# Altium footprint library LUMI_Handy_Soldering_LIB.PcbLib: 562 footprints (part 20 of 36)
Each footprint in its own frame and in the unit in brackets; x right, y up, seen from the top. Pads: shape width x height; smd on the part's side, far side on the other; paste and mask are expansions set on the pad; w line width, h text height; cw(c..) or ccw(c..) is an arc to the next point about the centre after c.
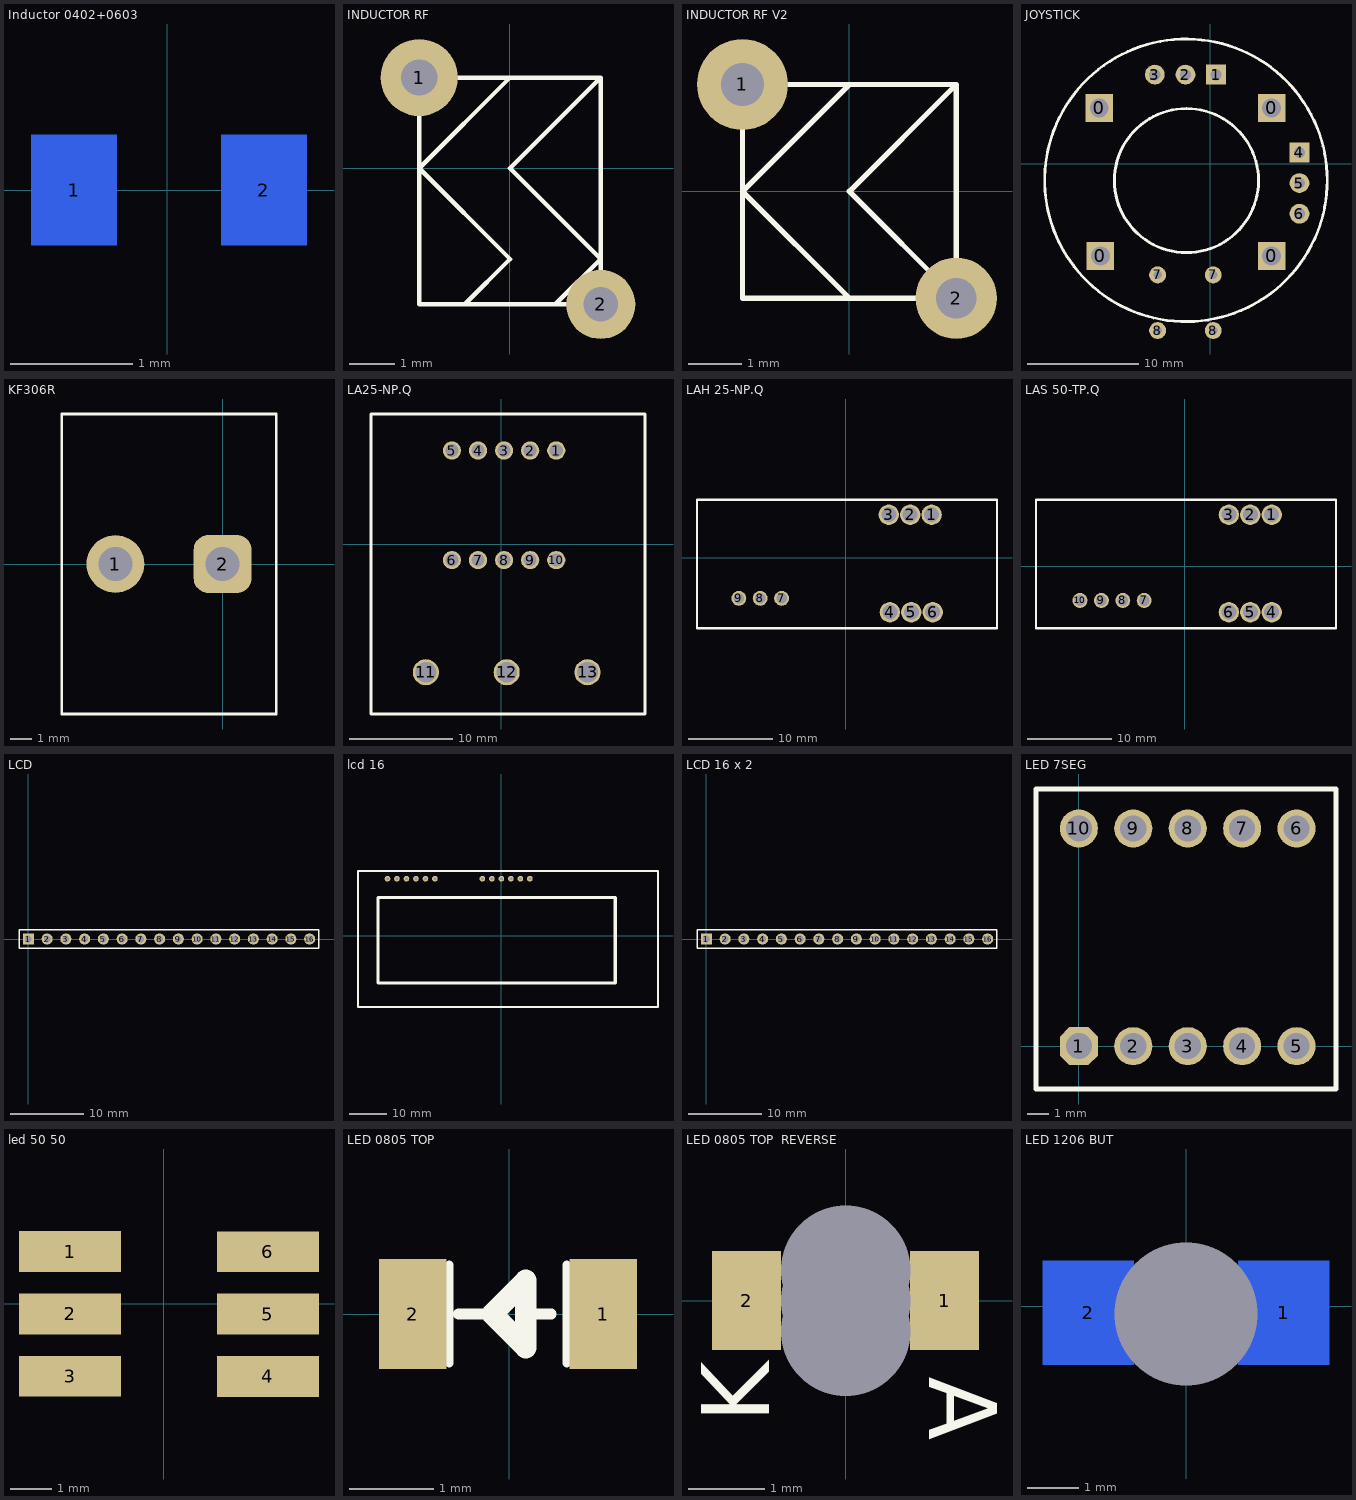
[diagram p19: the footprints below, top view; thin cyan lines are the x and y axes]

## Inductor 0402+0603 [mm]
pads (2):
  rect 0.7x0.9 smd far side: 1(-0.762,0) 2(0.787,0)
Bottom Overlay:
  rectangle: -0.356,-0.5 0,0.55
  lines w0.127: 0.321,-0.508 0.321,0.483 ; -1.143,-0.533 1.168,-0.533 1.168,0.533 -1.143,0.533 -1.143,-0.533
3D body: height 0.8, standoff 0, extent -0.8,-0.467 0.8,0.483

## INDUCTOR RF [mm]
pads (2):
  round 1.7 hole 0.8: 1(-2,2)
  round 1.524 hole 0.762: 2(2,-3)
Top Overlay:
  lines w0.1: -1,-3 0,-2 ; 1,-3 2,-2 ; 0,-2 0,-2 ; 0,-2 -2,0 0,2 2,2 ; 2,-2 2,-2 ; 2,-2 0,0 2,2 ; 2,2 2,-3 -2,-3 -2,2 2,2

## INDUCTOR RF V2 [mm]
pads (2):
  round 1.7 hole 0.8: 1(-2,2)
  round 1.524 hole 0.762: 2(2,-2)
Top Overlay:
  lines w0.1: 0,-2 -2,0 0,2 2,2 ; 0,-2 0,-2 ; 2,-2 -2,-2 -2,2 2,2 ; 2,-2 2,2 ; 2,-2 0,0 2,2 ; 2,-2 2,-2

## JOYSTICK [mm]
pads (14):
  rect 2.5x2.5 hole 1.7: 0(-10,5) 0(-9.9,-8.3) 0(5.5,-8.3) 0(5.5,5)
  rect 1.778x1.778 hole 1.016: 1(0.5,8) 4(8,1)
  round 1.778 hole 1.016: 2(-2.25,8) 3(-5,8) 5(8,-1.75) 6(8,-4.5)
  round 1.524 hole 0.762: 7(-4.75,-10) 7(0.25,-10) 8(-4.75,-15) 8(0.25,-15)
Top Overlay:
  circle w0.254: c-2.2,-1.5 r12.7
  circle w0.254: c-2.158,-1.524 r6.476
3D body: height 1.98, standoff -29.62, extent -15.108,-16.566 11.191,11.645

## KF306R [mm]
pads (2):
  round 2.7 hole 1.6: 1(-5,0)
  rrect50% 2.7x2.7 hole 1.6: 2(0,0)
Top Overlay:
  lines w0.127: -7.5,-7 -7.5,7 2.5,7 2.5,-7 -7.5,-7

## LA25-NP.Q [mil]
pads (13):
  round 70 hole 50: 1(210,360) 2(110,360) 3(10,360) 4(-90,360) 5(-190,360) 6(-190,-60) 7(-90,-60) 8(10,-60) 9(110,-60) 10(210,-60)
  round 100 hole 80: 11(-290,-490) 12(20,-490) 13(330,-490)
Top Overlay:
  lines w10: -500,-650 -500,-500 -500,500 -237.5,500 287.5,500 550,500 550,-650 -500,-650

## LAH 25-NP.Q [mil]
pads (9):
  round 95 hole 70: 1(400,200) 2(300,200) 3(200,200) 4(205,-255) 5(305,-255) 6(405,-255)
  round 70 hole 50: 7(-300,-190) 8(-400,-190) 9(-500,-190)
Top Overlay:
  lines w10: -695,-330 -195,-330 705,-330 705,270 -195,270 -695,270 -695,-330

## LAS 50-TP.Q [mil]
pads (10):
  round 95 hole 70: 1(405,240) 2(305,240) 3(205,240) 4(405,-215) 5(305,-215) 6(205,-215)
  round 70 hole 50: 7(-190,-160) 8(-290,-160) 9(-390,-160) 10(-490,-160)
Top Overlay:
  lines w10: -695,-290 -195,-290 705,-290 705,310 -195,310 -695,310 -695,-290

## LCD [mm] "Connector; Header; 16 Position"
pads (16):
  rect 1.5x1.5 hole 0.9: 1(0,0)
  round 1.5 hole 0.9: 2(2.54,0) 3(5.08,0) 4(7.62,0) 5(10.16,0) 6(12.7,0) 7(15.24,0) 8(17.78,0) 9(20.32,0) 10(22.86,0) 11(25.4,0) 12(27.94,0) 13(30.48,0) 14(33.02,0) 15(35.56,0) 16(38.1,0)
Top Overlay:
  lines w0.2: -1.27,-1.27 -1.27,1.27 0.635,1.27 39.37,1.27 39.37,-1.27 -1.27,-1.27
3D body: height 6.02, standoff -3.1, extent -1.219,-1.27 8.941,1.27
3D body: height 6.02, standoff -3.1, extent 8.89,-1.27 19.05,1.27
3D body: height 6.02, standoff -3.1, extent 19.05,-1.27 29.21,1.27
3D body: height 6.02, standoff -3.1, extent 29.185,-1.27 39.345,1.27
3D body: height 12.65, standoff 3.05, extent -15.672,-35.153 100.406,2.184

## lcd 16 [mil]
pads (12):
  round 60 hole 30: 1(-1200,600) 2(-1100,600) 3(-1000,600) 4(-900,600) 5(-800,600) 6(-700,600) 11(-200,600) 12(-100,600) 13(0,600) 14(100,600) 15(200,600) 16(300,600)
Top Overlay:
  lines w21.26: -1510,-750 -1510,680 1650,680 1650,-750 -1510,-750
  lines w31.5: -1300,400 1200,400
  lines w33.62: -1300,400 -1300,-500 1200,-500 1200,400
3D body: height 754, standoff 234, extent -1511.64,-758.5 1657.65,678.51
3D body: height 435.49, standoff 3.21, extent -1250,550 -1050,650
3D body: height 435.49, standoff 3.21, extent -1050,550 -850,650
3D body: height 435.49, standoff 3.21, extent -850,550 -650,650
3D body: height 435.49, standoff 3.21, extent -650,550 -450,650
3D body: height 435.49, standoff 3.21, extent -450,550 -250,650
3D body: height 435.49, standoff 3.21, extent -250,550 -50,650
3D body: height 435.49, standoff 3.21, extent -50,550 150,650
3D body: height 435.49, standoff 3.21, extent 150,550 350,650
3D body: height 237.01, standoff -122.05, extent -1250,550 -850,650
3D body: height 237.01, standoff -122.05, extent -850,550 -450,650
3D body: height 237.01, standoff -122.05, extent -450,550 -50,650
3D body: height 237.01, standoff -122.05, extent -49.99,550.01 350.01,650.01

## LCD 16 x 2 [mm] "Connector; Header; 16 Position"
pads (16):
  rect 1.5x1.5 hole 0.9: 1(0,0)
  round 1.5 hole 0.9: 2(2.54,0) 3(5.08,0) 4(7.62,0) 5(10.16,0) 6(12.7,0) 7(15.24,0) 8(17.78,0) 9(20.32,0) 10(22.86,0) 11(25.4,0) 12(27.94,0) 13(30.48,0) 14(33.02,0) 15(35.56,0) 16(38.1,0)
Top Overlay:
  lines w0.2: -1.27,-1.27 -1.27,1.27 0.635,1.27 39.37,1.27 39.37,-1.27 -1.27,-1.27
3D body: height 10.52, standoff -2.69, extent -8.093,-34.506 72.407,1.994

## LED 7SEG [mil]
pads (10):
  oct 70x70 hole 48: 1(0,0)
  round 70 hole 48: 2(100,0) 3(200,0) 4(300,0) 5(400,0) 6(400,400) 7(300,400) 8(200,400) 9(100,400) 10(0,400)
Top Overlay:
  lines w10: -78.74,-78.74 -78.74,472.44 472.44,472.44 472.44,-78.74 -78.74,-78.74

## led 50 50 [mm]
pads (6):
  rect 2.5x1 smd: 1(-2.286,1.27) 2(-2.286,-0.254) 3(-2.286,-1.778) 4(2.55,-1.782) 5(2.55,-0.258) 6(2.55,1.266)
3D body: height 1.6, standoff 0, extent -2.55,-2.75 2.75,2.25

## LED 0805 TOP [mm]
pads (2):
  rect 0.8x1.3 smd: 1(1.118,0) 2(-1.143,0)
Top Overlay:
  lines w0.1: -0.711,-0.584 -0.711,0.584 ; 0.686,-0.584 0.686,0.584
  lines w0.127: -0.6,0 -0.2,0 ; 0.2,0 0.5,0
  lines w0.254: -0.2,0 0.2,-0.4 0.2,0.4 -0.2,0
3D body: height 1.1, standoff 0, extent -1.01,-0.625 1.01,0.625

## LED 0805 TOP  REVERSE [mm]
pads (5):
  rect 0x0 hole 1.7: 0(0,-0.4) 0(0,0) 0(0,0.4)
  rect 0.902x1.3 smd: 1(1.3,0) 2(-1.3,0)
Top Overlay:
  lines w0.1: -0.711,-0.584 -0.711,0.584 ; 0.686,-0.584 0.686,0.584
  text "A" at 1.1,-1 h0.89
  text "K" at -1,-1.6 h0.89
3D body: height 0.5, standoff -0.6, extent -1.01,-0.625 1.01,0.625

## LED 1206 BUT [mil]
pads (3):
  rect 70x80 smd far side: 1(75,-5) 2(-75,-5)
  round 0 hole 110: ""(0,-6)
Bottom Overlay:
  lines w5: -110,-43 -110,33 110,33 110,-43 -110,-43
3D body: height 8.81, standoff -50.9, extent -64,-36 62,27